# Altium footprint library self_pcblib v1.8.6.PcbLib: 123 footprints (part 8 of 8)
Each footprint in its own frame and in the unit in brackets; x right, y up, seen from the top. Pads: shape width x height; smd on the part's side, far side on the other; paste and mask are expansions set on the pad; w line width, h text height; cw(c..) or ccw(c..) is an arc to the next point about the centre after c.
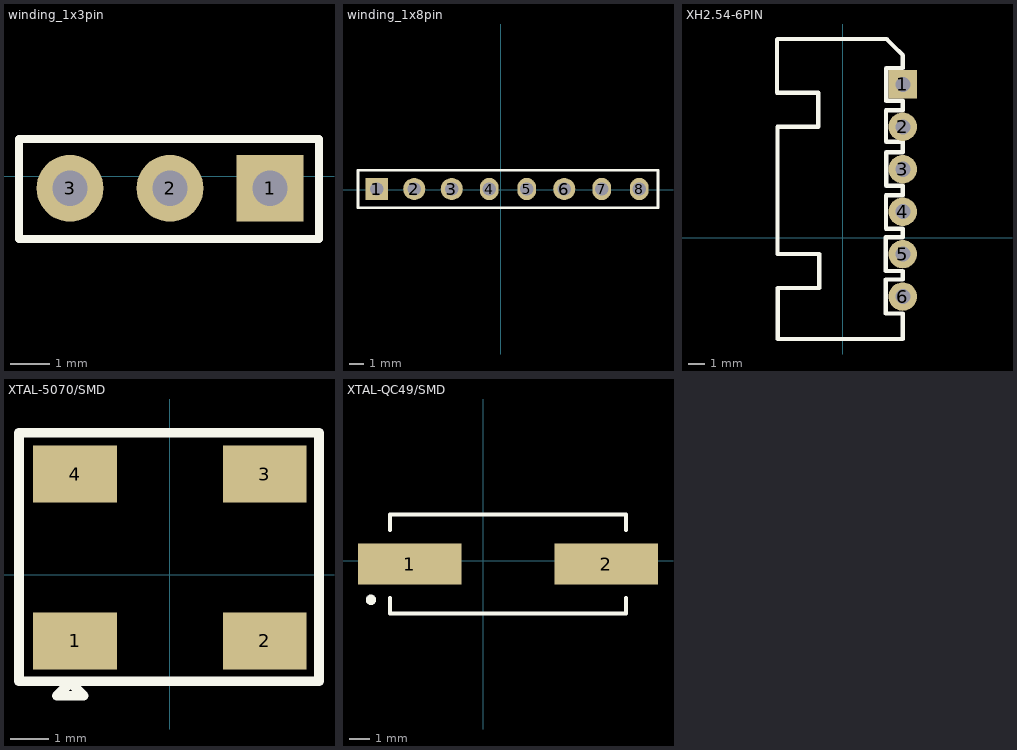
[diagram p7: the footprints below, top view; thin cyan lines are the x and y axes]

## winding_1x3pin [mm]
pads (3):
  rect 1.7x1.7 hole 0.9: 1(15.25,-0.31)
  round 1.7 hole 0.9: 2(12.71,-0.31) 3(10.17,-0.31)
Top Overlay:
  lines w0.2: 8.874,-1.599 16.494,-1.599 16.494,0.941 8.874,0.941 8.874,-1.599
3D body "HDR2.54-1P_H.STEP": height 4.85, standoff -3, extent 13.98,-1.58 16.52,7.46
3D body "HDR2.54-1P_H.STEP": height 4.85, standoff -3, extent 11.44,-1.58 13.98,7.46
3D body "HDR2.54-1P_H.STEP": height 4.85, standoff -3, extent 8.9,-1.58 11.44,7.46

## winding_1x4pin [mm]

## winding_1x5pin [mm]

## winding_1x8pin [mm]
pads (8):
  rect 1.5x1.5 hole 0.9: 1(-8.382,0.051)
  round 1.5 hole 0.9: 2(-5.842,0.051) 3(-3.302,0.051) 6(4.318,0.051)
  oval 1.27x1.5 hole 0.9: 4(-0.762,0.051) 5(1.778,0.051) 7(6.858,0.051) 8(9.398,0.051)
Top Overlay:
  lines w0.2: -9.652,-1.219 10.668,-1.219 10.668,1.321 -9.652,1.321 -9.652,-1.219
3D body "65792.stp": height 1.27, standoff -4.27, extent -9.677,-0.278 10.643,10.082

## winding_2x2pin [mm]

## winding_2x3pin [mm]

## winding_2x4pin [mm]

## winding_2x5pin [mm]

## XH2.54-6PIN [mm]
pads (6):
  rect 1.7x1.7 hole 0.9: 1(3.581,9.195)
  round 1.7 hole 0.9: 2(3.581,6.655) 3(3.581,4.115) 4(3.581,1.575) 5(3.581,-0.965) 6(3.581,-3.505)
Top Overlay:
  lines w0.254: 2.585,5.117 2.585,3.129 2.591,3.123 3.581,3.123 3.581,2.577 ; 2.585,5.137 3.581,5.137 ; 3.581,2.563 2.579,2.563 2.579,0.559 3.581,0.559 3.581,0.051 2.565,0.051 2.565,-1.981 3.581,-1.981 3.581,-2.489 2.565,-2.489 2.565,-4.521 3.581,-4.521 3.581,-6.045 -3.909,-6.045 -3.909,-2.997 -1.425,-2.997 -1.425,-0.965 -3.921,-0.965 -3.921,6.655 -1.477,6.655 -1.477,8.687 -3.947,8.687 -3.947,11.885 -3.921,11.911 2.615,11.911 2.999,11.527 3.581,10.945 3.581,10.169 2.599,10.169 2.585,10.155 2.585,8.199 2.599,8.213 3.581,8.213 3.581,7.641 2.579,7.641 2.579,5.775 2.593,5.761 3.581,5.761 ; 3.581,5.151 3.581,5.749
3D body "XH2.54-6P_H.STEP": height 5.75, standoff -3.35, extent -3.769,-6.005 3.931,11.695

## XTAL-5070/SMD [mm]
pads (4):
  rect 2.2x1.5 smd: 1(-2.484,-1.741) 2(2.496,-1.741) 3(2.496,2.639) 4(-2.484,2.639)
Top Overlay:
  lines w0.254: -3.956,-2.802 -3.956,3.726 3.918,3.726 3.918,-2.802 -3.956,-2.802 ; -2.966,-3.183 -2.255,-3.183 -2.61,-2.828 -2.966,-3.183
3D body "User Library-cwx815.STEP": height 1, standoff -0.01, extent -3.644,-1.989 3.656,2.811

## XTAL-QC49/SMD [mm]
pads (2):
  rect 5x2 smd: 1(-3.556,-0.152) 2(5.944,-0.152)
Top Overlay:
  circle w0.25: c-5.431,-1.882 r0.125
  lines w0.2: -4.506,-1.802 -4.506,-2.552 6.894,-2.552 6.894,-1.802 ; -4.506,1.498 -4.506,2.248 6.894,2.248 6.894,1.498
3D body "XTAL-49S(1).step": height 4.31, standoff 0, extent -4.88,-2.544 7.42,2.286